# Altium footprint library footprints.PcbLib: 33 footprints (part 1 of 3)
Each footprint in its own frame and in the unit in brackets; x right, y up, seen from the top. Pads: shape width x height; smd on the part's side, far side on the other; paste and mask are expansions set on the pad; w line width, h text height; cw(c..) or ccw(c..) is an arc to the next point about the centre after c.
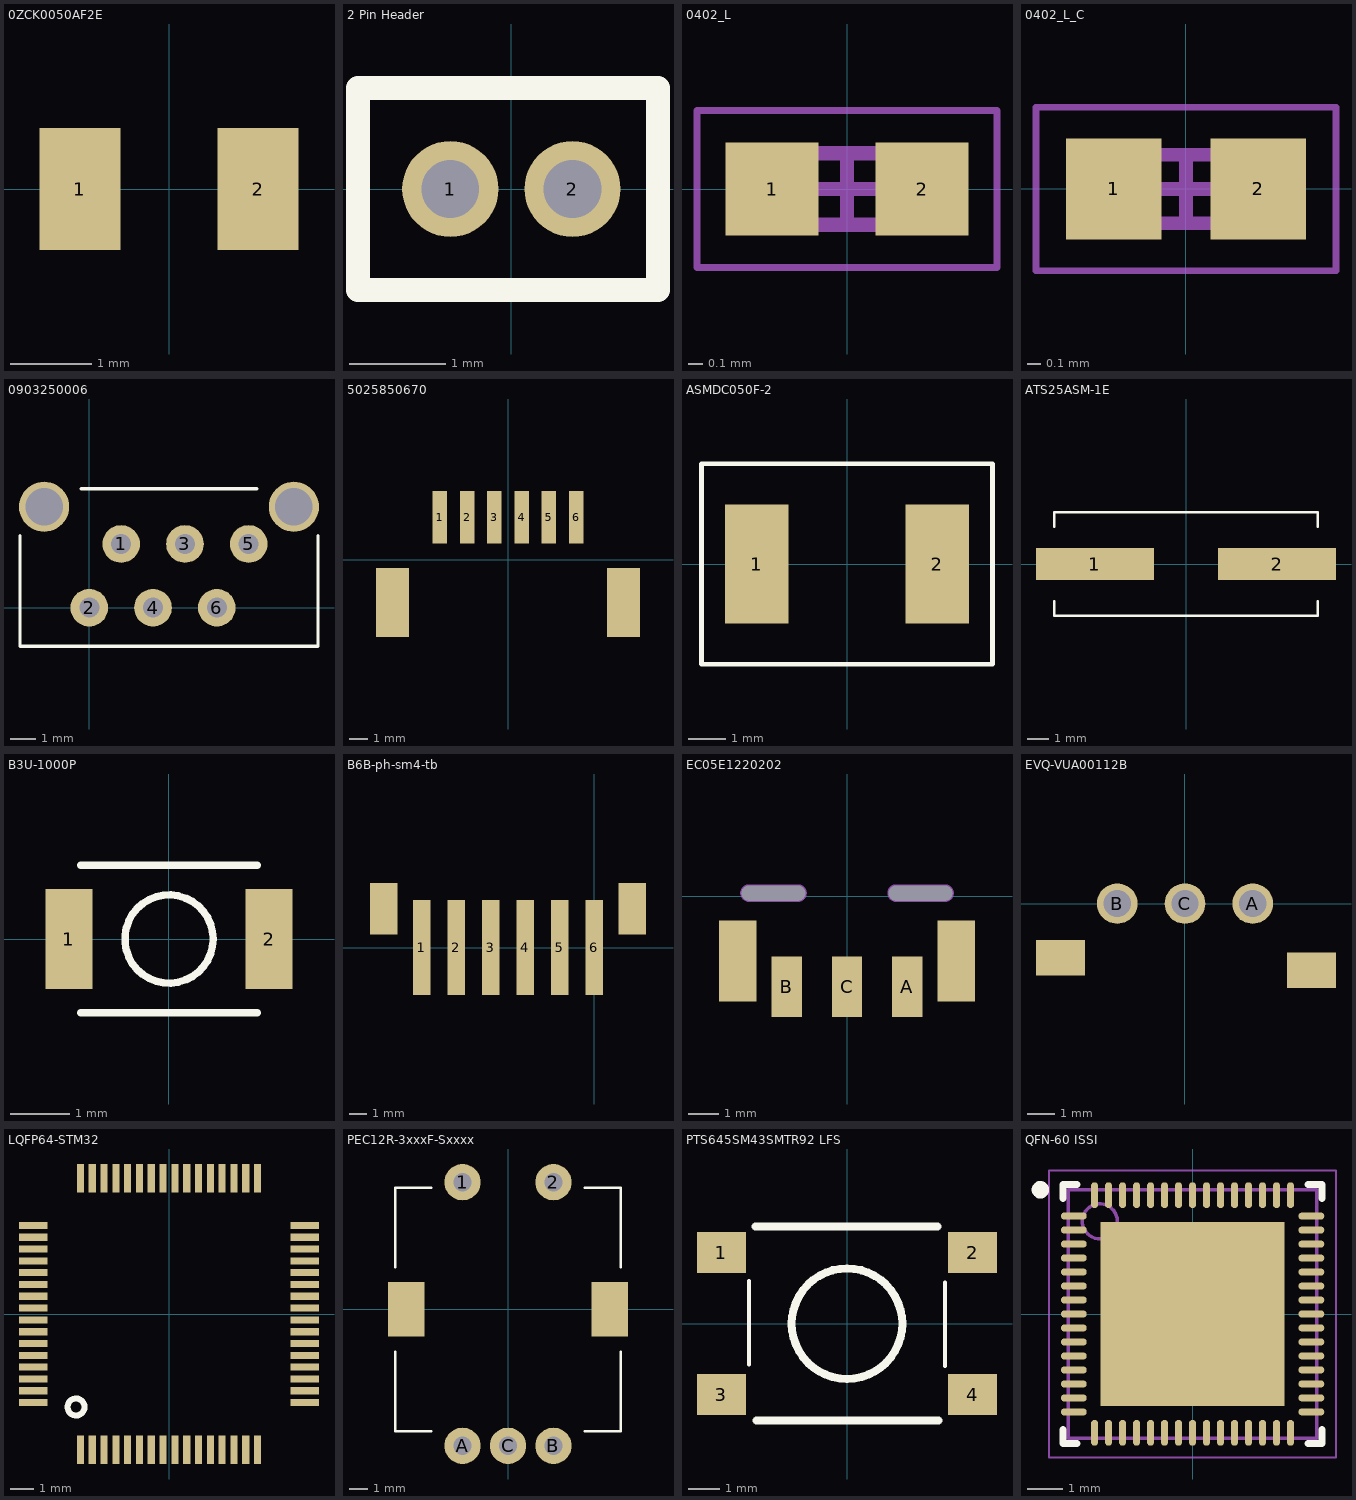
[diagram p0: the footprints below, top view; thin cyan lines are the x and y axes]

## 0ZCK0050AF2E [mm] "Polyfuse 500mA hold 1A trip 0805"
pads (2):
  rect 1x1.5 smd: 1(-1.1,0) 2(1.1,0)
3D body: height 1, standoff 0, extent -1.132,-0.763 1.168,0.737

## 2 Pin Header [mm]
pads (2):
  round 1 hole 0.6: 1(-0.635,0) 2(0.635,0)
Top Overlay:
  lines w0.254: -1.595,-1.05 1.524,-1.05 1.524,1.05 -1.595,1.05 -1.595,-1.05

## 0402_L [mm] "Chip Resistor, 2-Leads, Body 1.00x0.50mm, IPC Low Density"
height 0.35
pads (2):
  rect 0.65x0.65 smd: 1(-0.525,0) 2(0.525,0)
Mechanical 13:
  lines w0.1: -0.5,-0.25 0.5,-0.25 0.5,0.25 -0.5,0.25 -0.5,-0.25
Mechanical 15:
  lines w0.05: -1.05,-0.55 1.05,-0.55 1.05,0.55 -1.05,0.55 -1.05,-0.55
  lines w0.1: -0.25,0 0.25,0 ; 0,-0.25 0,0.25
3D body: height 0.35, standoff 0, extent 0.3,-0.25 0.5,0.25
3D body: height 0.35, standoff 0, extent -0.5,-0.25 -0.3,0.25
3D body: height 0.35, standoff 0, extent -0.3,-0.25 0.3,0.25

## 0402_L_C [mm] "0402 SMD for chip capacitor"
height 0.35
pads (2):
  rect 0.7x0.74 smd: 1(-0.53,0) 2(0.53,0)
Mechanical 13:
  lines w0.1: -0.5,-0.25 0.5,-0.25 0.5,0.25 -0.5,0.25 -0.5,-0.25
Mechanical 15:
  lines w0.05: -1.1,-0.6 1.1,-0.6 1.1,0.6 -1.1,0.6 -1.1,-0.6
  lines w0.1: -0.25,0 0.25,0 ; 0,-0.25 0,0.25
3D body: height 0.35, standoff 0, extent 0.3,-0.25 0.5,0.25
3D body: height 0.35, standoff 0, extent -0.5,-0.25 -0.3,0.25
3D body: height 0.35, standoff 0, extent -0.3,-0.25 0.3,0.25

## 0903250006 [mm] "CONN HEADER 6POS 1.27MM TIN PicoFlex"
pads (8):
  round 1.5 hole 0.8 unplated: 1(1.27,2.54) 2(0,0) 3(3.81,2.54) 4(2.54,0) 5(6.35,2.54) 6(5.08,0)
  round 2 hole 1.5 unplated: ""(-1.8,4.02) ""(8.15,4.02)
Top Overlay:
  lines w0.127: -2.755,2.87 -2.755,-1.539 9.105,-1.539 9.105,2.87 ; -0.325,4.741 6.675,4.741
3D body "903250006.stp": height 6.41, standoff -3.29, extent -2.755,-1.539 9.105,4.741

## 5025850670 [mm] "CONN SGL R/A RCPT 6CKT CLIK-MATE"
pads (8):
  rect 0.8x2.9 smd: 1(-3.75,2.35) 2(-2.25,2.35) 3(-0.75,2.35) 4(0.75,2.35) 5(2.25,2.35) 6(3.75,2.35)
  rect 1.8x3.8 smd: ""(-6.35,-2.35) ""(6.35,-2.35)
3D body "5025850670.stp": height 6.41, standoff 0.01, extent -6.65,-5.425 6.65,3.075

## ASMDC050F-2 [mm] "Resettable Fuses - PPTC .5A 60VDC 10A 2920 AEC-Q200 1A Trip"
pads (2):
  rect 1.68x3.15 smd: 1(-2.39,0) 2(2.39,0)
Top Overlay:
  lines w0.127: -3.85,-2.65 -3.85,2.65 3.85,2.65 3.85,-2.65 -3.85,-2.65
3D body: height 0.9, standoff 0, extent -3.85,-2.65 3.85,2.65

## ATS25ASM-1E [mm] "25MHz Crystal"
pads (2):
  rect 5.5x1.5 smd: 1(-4.25,0) 2(4.25,0)
Top Overlay:
  lines w0.127: -6.15,-1.753 -6.15,-2.415 6.15,-2.415 6.15,-1.753 ; -6.15,1.753 -6.15,2.415 6.15,2.415 6.15,1.753

## B3U-1000P [mm] "Switch Tactile SPST-NO 0.05A 12V"
pads (2):
  rect 0.8x1.7 smd: 1(-1.7,0) 2(1.7,0)
Top Overlay:
  circle w0.127: c0,0 r0.75
  lines w0.127: -1.5,-1.25 1.5,-1.25 ; -1.5,1.25 1.5,1.25
3D body: height 1, standoff 0, extent -1.499,-1.25 1.5,1.25
3D body: height 1.6, standoff 1.2, extent -0.744,-0.749 0.75,0.749

## B6B-ph-sm4-tb [mm] "CONN HEADER PH TOP 6POS 2MM SMD"
pads (8):
  rect 1x5.5 smd: 1(-10,0) 2(-8,0) 3(-6,0) 4(-4,0) 5(-2,0) 6(0,0)
  rect 1.6x3 smd: ""(-12.2,2.25) ""(2.2,2.25)
3D body "B6B-PH-SM4-TB(LF)(SN)--3DModel-STEP-56544.STEP": height 6.61, standoff -0.14, extent -12.961,-2.316 2.989,4.684

## EC05E1220202 [mm] "encoder, 4.5mm"
pads (9):
  rect 1x2 smd: A(2,-3) B(-2,-3) C(0,-3)
  rect 1.25x2.7 smd: ""(-3.625,-2.15) ""(3.625,-2.15)
  round 0 on Mech1: ""(-2.44,0)
  round 0 hole 0.5 slot 2.12 at 0 deg unplated: ""(-2.44,0.1) ""(2.44,0.1)
  rect 0x0 on Mech1 rot 45: ""(2.44,0)
Mechanical 1:
  circle w0.127: c1.626,0.103 r0.227
  circle w0.127: c-1.626,0.103 r0.227
  circle w0.127: c-3.251,0.103 r0.227
  circle w0.127: c3.251,0.103 r0.227
  region: -0.686,-0.178
  lines w0.127: -3.251,-0.127 -1.626,-0.127 ; -3.251,-0.124 cw(c-3.251,0.103) -3.251,0.33 -1.626,0.33 ; -1.626,-0.126 ccw(c-1.626,0.102) -1.626,0.329 ; 1.626,-0.127 3.251,-0.127 ; 1.626,-0.124 cw(c1.626,0.103) 1.626,0.33 3.251,0.33 cw(c3.251,0.103) 3.251,-0.124
3D body "EC05E1220202.step": height 7.27, standoff -1.48, extent -3.766,-2.919 3.734,0.356

## EVQ-VUA00112B [mm] "Encoder"
pads (5):
  round 1.5 hole 1 unplated: A(2.5,0) B(-2.5,0) C(0,0)
  rect 1.8x1.3 smd: ""(-4.597,-2) ""(4.674,-2.464)

## LQFP64-STM32 [mm]
pads (64):
  rect 0.3x1.2 smd: 1(-3.75,-5.75) 2(-3.25,-5.75) 3(-2.75,-5.75) 4(-2.25,-5.75) 5(-1.75,-5.75) 6(-1.25,-5.75) 7(-0.75,-5.75) 8(-0.25,-5.75) 9(0.25,-5.75) 10(0.75,-5.75) 11(1.25,-5.75) 12(1.75,-5.75) 13(2.25,-5.75) 14(2.75,-5.75) 15(3.25,-5.75) 16(3.75,-5.75) 33(3.75,5.75) 34(3.25,5.75) 35(2.75,5.75) 36(2.25,5.75) 37(1.75,5.75) 38(1.25,5.75) 39(0.75,5.75) 40(0.25,5.75) 41(-0.25,5.75) 42(-0.75,5.75) 43(-1.25,5.75) 44(-1.75,5.75) 45(-2.25,5.75) 46(-2.75,5.75) 47(-3.25,5.75) 48(-3.75,5.75)
  rect 1.2x0.3 smd: 17(5.75,-3.75) 18(5.75,-3.25) 19(5.75,-2.75) 20(5.75,-2.25) 21(5.75,-1.75) 22(5.75,-1.25) 23(5.75,-0.75) 24(5.75,-0.25) 25(5.75,0.25) 26(5.75,0.75) 27(5.75,1.25) 28(5.75,1.75) 29(5.75,2.25) 30(5.75,2.75) 31(5.75,3.25) 32(5.75,3.75) 49(-5.75,3.75) 50(-5.75,3.25) 51(-5.75,2.75) 52(-5.75,2.25) 53(-5.75,1.75) 54(-5.75,1.25) 55(-5.75,0.75) 56(-5.75,0.25) 57(-5.75,-0.25) 58(-5.75,-0.75) 59(-5.75,-1.25) 60(-5.75,-1.75) 61(-5.75,-2.25) 62(-5.75,-2.75) 63(-5.75,-3.25) 64(-5.75,-3.75)
Top Overlay:
  circle w0.254: c-3.937,-3.937 r0.359

## PEC12R-3xxxF-Sxxxx [mm] "Vertical Rotary Encoder"
pads (7):
  round 2 hole 1: 1(-2.5,7) 2(2.5,7) A(-2.5,-7.5) B(2.5,-7.5) C(0,-7.5)
  rect 2x3 smd: ""(-5.6,0) ""(5.6,0)
Top Overlay:
  lines w0.127: -6.2,-2.311 -6.2,-6.7 -4.216,-6.7 ; -6.2,2.311 -6.2,6.7 -4.216,6.7 ; 4.216,-6.7 6.2,-6.7 6.2,-2.311 ; 4.216,6.7 6.2,6.7 6.2,2.311
3D body "PEC12R-3025F-S0024.STEP": height 25.01, standoff 0.01, extent -6.2,-6.675 6.2,6.725

## PTS645SM43SMTR92 LFS [mm] "Surface mount tac button"
pads (4):
  rect 1.55x1.3 smd: 1(-3.975,2.25) 2(3.975,2.25) 3(-3.975,-2.25) 4(3.975,-2.25)
Top Overlay:
  circle w0.254: c0,0 r1.75
  region: -2.667,3.683
  lines w0.127: -3.1,-1.295 -3.1,1.346 ; 3.1,-1.346 3.1,1.295
  lines w0.254: -2.896,3.073 2.87,3.073 ; -2.87,-3.073 2.896,-3.073

## QFN-60 ISSI [mm] "QFN, 60-Leads, Body 7.00x7.00mm, Pitch 0.40mm, Thermal Pad 5.25x5.25mm, IPC Medium Density"
height 0.8
pads (61):
  oval 0.74x0.2 smd: 1(-3.395,2.8) 2(-3.395,2.4) 3(-3.395,2) 4(-3.395,1.6) 5(-3.395,1.2) 6(-3.395,0.8) 7(-3.395,0.4) 8(-3.395,0) 9(-3.395,-0.4) 10(-3.395,-0.8) 11(-3.395,-1.2) 12(-3.395,-1.6) 13(-3.395,-2) 14(-3.395,-2.4) 15(-3.395,-2.8) 31(3.395,-2.8) 32(3.395,-2.4) 33(3.395,-2) 34(3.395,-1.6) 35(3.395,-1.2) 36(3.395,-0.8) 37(3.395,-0.4) 38(3.395,0) 39(3.395,0.4) 40(3.395,0.8) 41(3.395,1.2) 42(3.395,1.6) 43(3.395,2) 44(3.395,2.4) 45(3.395,2.8)
  oval 0.2x0.74 smd: 16(-2.8,-3.395) 17(-2.4,-3.395) 18(-2,-3.395) 19(-1.6,-3.395) 20(-1.2,-3.395) 21(-0.8,-3.395) 22(-0.4,-3.395) 23(0,-3.395) 24(0.4,-3.395) 25(0.8,-3.395) 26(1.2,-3.395) 27(1.6,-3.395) 28(2,-3.395) 29(2.4,-3.395) 30(2.8,-3.395) 46(2.8,3.395) 47(2.4,3.395) 48(2,3.395) 49(1.6,3.395) 50(1.2,3.395) 51(0.8,3.395) 52(0.4,3.395) 53(0,3.395) 54(-0.4,3.395) 55(-0.8,3.395) 56(-1.2,3.395) 57(-1.6,3.395) 58(-2,3.395) 59(-2.4,3.395) 60(-2.8,3.395)
  rect 5.25x5.25 smd: ""(0,0)
Top Overlay:
  circle w0.25: c-4.35,3.55 r0.125
  lines w0.2: -3.7,-3.3 -3.7,-3.7 -3.3,-3.7 ; -3.7,3.3 -3.7,3.7 -3.3,3.7 ; 3.3,-3.7 3.7,-3.7 3.7,-3.3 ; 3.3,3.7 3.7,3.7 3.7,3.3
Mechanical 13:
  circle w0.1: c-2.65,2.65 r0.5
  lines w0.1: -3.55,-3.55 -3.55,3.55 3.55,3.55 3.55,-3.55 -3.55,-3.55
Mechanical 15:
  lines w0.05: -4.1,-4.1 -4.1,4.1 4.1,4.1 4.1,-4.1 -4.1,-4.1
  lines w0.1: -0.5,0 0.5,0 ; 0,-0.5 0,0.5
3D body "QFN-60 ISSI.step": height 0.8, standoff 0, extent -3.551,-3.551 3.551,3.551